# Altium footprint library Connectors.PcbLib: 135 footprints (part 8 of 9)
Each footprint in its own frame and in the unit in brackets; x right, y up, seen from the top. Pads: shape width x height; smd on the part's side, far side on the other; paste and mask are expansions set on the pad; w line width, h text height; cw(c..) or ccw(c..) is an arc to the next point about the centre after c.
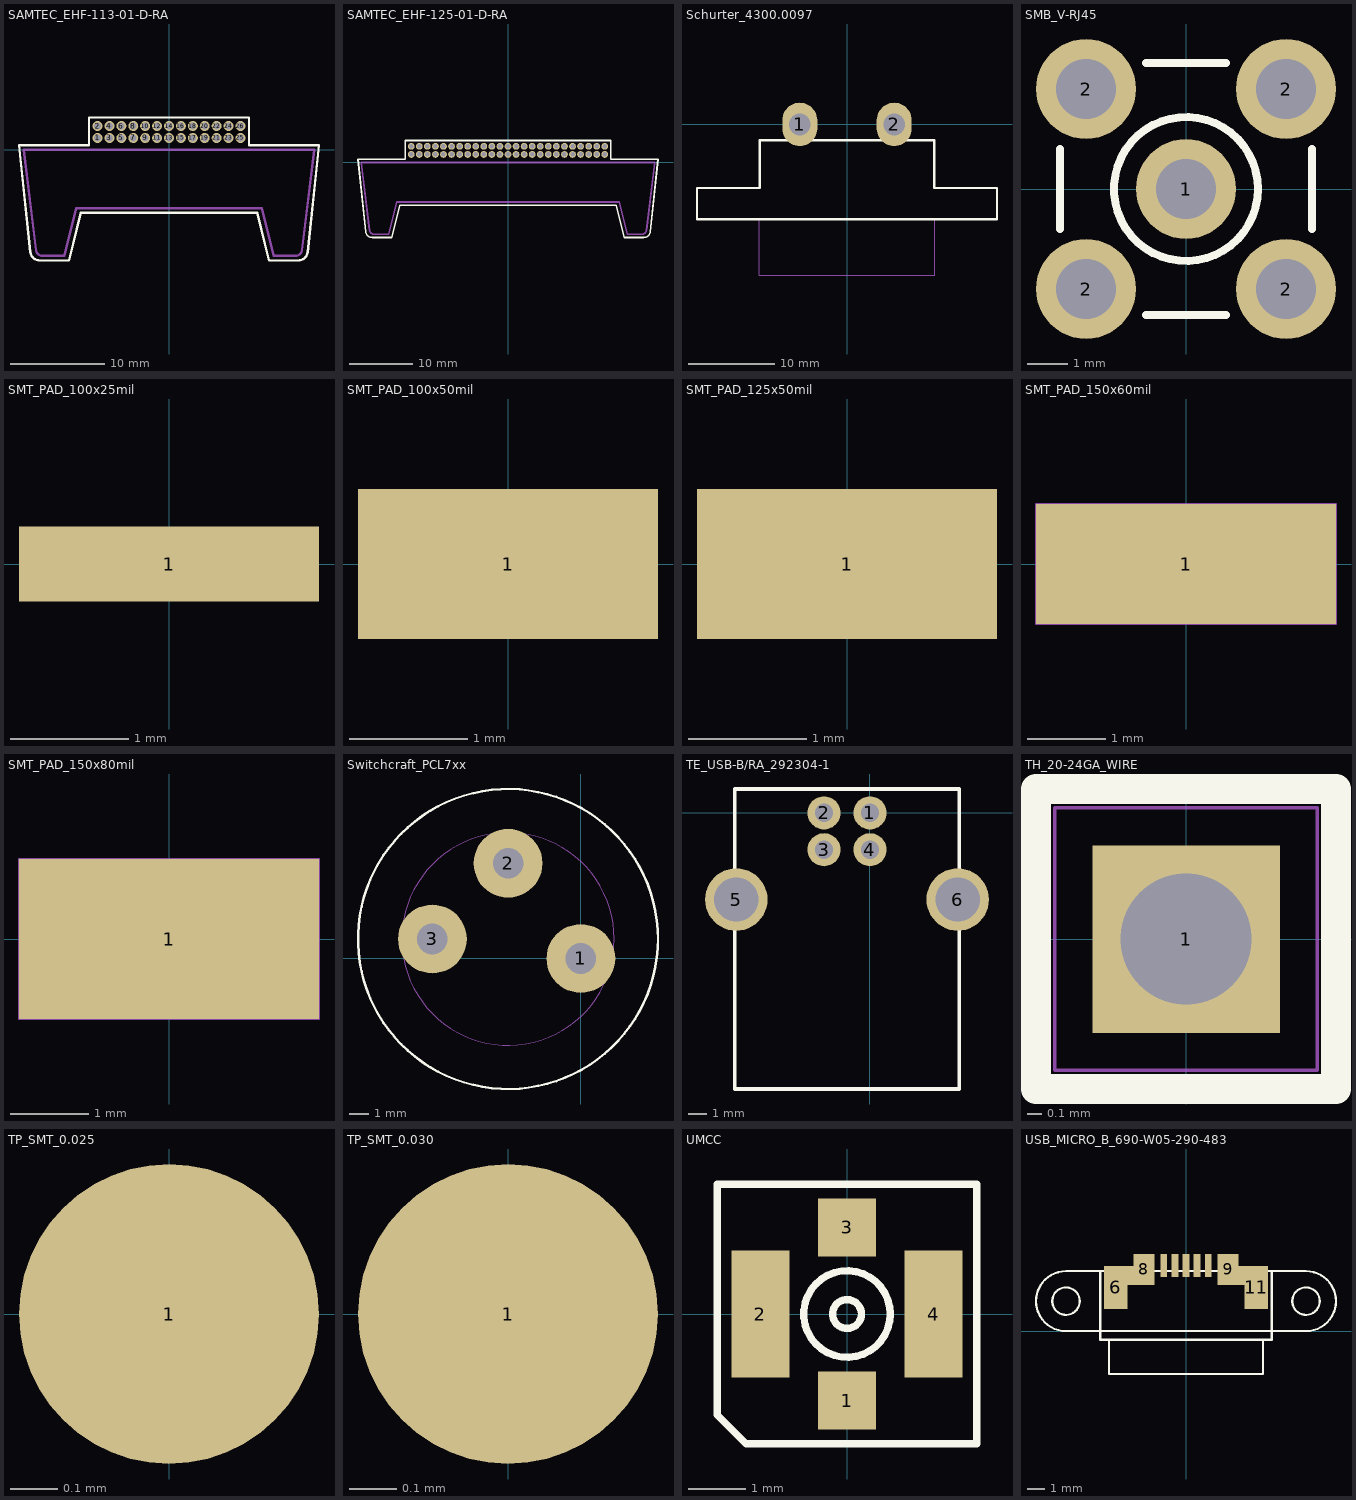
[diagram p7: the footprints below, top view; thin cyan lines are the x and y axes]

## SAMTEC_EHF-113-01-D-RA [mil]
pads (26):
  round 42 hole 28 mask+3: 1(-300,50) 2(-300,100) 3(-250,50) 4(-250,100) 5(-200,50) 6(-200,100) 7(-150,50) 8(-150,100) 9(-100,50) 10(-100,100) 11(-50,50) 12(-50,100) 13(0,50) 14(0,100) 15(50,50) 16(50,100) 17(100,50) 18(100,100) 19(150,50) 20(150,100) 21(200,50) 22(200,100) 23(250,50) 24(250,100) 25(300,50) 26(300,100)
Top Overlay:
  lines w10: -630,20 -336,20 -336,136 336,136 336,20 630,20 582.48,-429.21 cw(c542.7,-425) 542.7,-465 420,-465 370,-265 -370,-265 -420,-465 -542.7,-465 cw(c-542.7,-425) -582.48,-429.18 -630,20
Mechanical 1:
  lines w10: -610,0 -558.74,-420.82 ccw(c-531.45,-417.5) -531.45,-445 -440,-445 -390,-245 390,-245 440,-445 531.45,-445 ccw(c531.45,-417.5) 558.75,-420.8 610,0 -610,0
  text "J1" at -17.57,-108 h30

## SAMTEC_EHF-125-01-D-RA [mil]
pads (50):
  round 42 hole 28 mask+3: 1(-600,50) 2(-600,100) 3(-550,50) 4(-550,100) 5(-500,50) 6(-500,100) 7(-450,50) 8(-450,100) 9(-400,50) 10(-400,100) 11(-350,50) 12(-350,100) 13(-300,50) 14(-300,100) 15(-250,50) 16(-250,100) 17(-200,50) 18(-200,100) 19(-150,50) 20(-150,100) 21(-100,50) 22(-100,100) 23(-50,50) 24(-50,100) 25(0,50) 26(0,100) 27(50,50) 28(50,100) 29(100,50) 30(100,100) 31(150,50) 32(150,100) 33(200,50) 34(200,100) 35(250,50) 36(250,100) 37(300,50) 38(300,100) 39(350,50) 40(350,100) 41(400,50) 42(400,100) 43(450,50) 44(450,100) 45(500,50) 46(500,100) 47(550,50) 48(550,100) 49(600,50) 50(600,100)
Top Overlay:
  lines w10: -930,20 -636,20 -636,136 636,136 636,20 930,20 882.48,-429.21 cw(c842.7,-425) 842.7,-465 720,-465 670,-265 -670,-265 -720,-465 -842.7,-465 cw(c-842.7,-425) -882.48,-429.18 -930,20
Mechanical 1:
  lines w10: -910,0 -858.74,-420.82 ccw(c-831.45,-417.5) -831.45,-445 -740,-445 -690,-245 690,-245 740,-445 831.45,-445 ccw(c831.45,-417.5) 858.75,-420.8 910,0 -910,0
  text "J1" at -17.57,-108 h30

## Schurter_4300.0097 [mm] "IEC 320-C8 Power Entry Connector"
pads (2):
  oval 4.064x5.08 hole 2.54 paste-5.08: 1(-5.5,0) 2(5.5,0)
Top Overlay:
  lines w0.254: 17.491,-11 17.491,-11.048 ; 17.491,-11.048 17.491,-7.425 10.183,-7.425 10.183,-1.838 0,-1.838 -10.183,-1.838 -10.183,-7.425 -17.491,-7.425 -17.491,-11.048 17.491,-11.048
Mechanical 1:
  lines w0.127: -10.25,-11.025 -10.25,-17.6 10.25,-17.6 10.25,-11.025 ; 17.491,-11 17.491,-11.048 ; 17.491,-11.048 -17.491,-11.048 -17.491,-7.425 -10.183,-7.425 -10.183,-1.838 0,-1.838 10.183,-1.838 10.183,-7.425 17.491,-7.425 17.491,-11.048
3D body "4300-0097.stp": height 15, standoff -3.7, extent -17.5,-17.733 17.5,1.017

## SMB_V-RJ45 [mm] "Connector; SMB Straight"
pads (5):
  round 2.5 hole 1.5: 1(0,0) 2(-2.5,-2.5) 2(-2.5,2.5) 2(2.5,-2.5) 2(2.5,2.5)
Top Overlay:
  circle w0.2: c0,0 r1.8
  lines w0.2: -3.15,-1 -3.15,1 ; -1,-3.15 1,-3.15 ; -1,3.15 1,3.15 ; 3.15,-1 3.15,1
Mechanical 1:
  circle w0.025: c0,0 r1.8
  circle w0.025: c0,0 r1.05
  circle w0.025: c0,0 r0.2

## SMT_PAD_100x25mil [mm] "Surface Mount Pad For Wire"
height 0.025
pads (1):
  rect 2.54x0.635 smd paste+0 mask+0: 1(0,0)

## SMT_PAD_100x50mil [mm] "Surface Mount Pad For Wire"
height 0.025
pads (1):
  rect 2.54x1.27 smd paste+0 mask+0: 1(0,0)

## SMT_PAD_125x50mil [mm] "Surface Mount Pad For Wire"
height 0.025
pads (1):
  rect 2.54x1.27 smd paste+0 mask+0: 1(0,0)

## SMT_PAD_150x60mil [mil] "Surface Mount Pad For Wire"
height 1
pads (1):
  rect 150x60 smd paste+0 mask+0: 1(0,0)
Mechanical 1:
  lines w1: -75,-30 -75,30 75,30 75,-30 -75,-30
3D body: height 2, standoff 0, extent -75,-30 75,30

## SMT_PAD_150x80mil [mil] "Surface Mount Pad For Wire"
height 1
pads (1):
  rect 150x80 smd paste+0 mask+0: 1(0,0)
Mechanical 1:
  lines w1: -75,-40 -75,40 75,40 75,-40 -75,-40
3D body: height 2, standoff 0, extent -75,-40 75,40

## Switchcraft_PCL7xx [mm] "Barrel Jack, Sealed, Vertical TH"
height 12.9
pads (3):
  round 3.6 hole 1.6: 1(0,0) 2(-3.81,4.98) 3(-7.77,1.02)
Top Overlay:
  circle w0.127: c-3.813,1.02 r7.85
Mechanical 1:
  circle w0.025: c-3.813,1.02 r7.85
  circle w0.025: c0.017,-0.006 r0.486
  circle w0.025: c-3.785,4.99 r0.486
  circle w0.025: c-7.77,1.02 r0.486
  circle w0.025: c-3.813,1.02 r5.56
  text ".Designator" at -12.469,7.37 h1.52
3D body "PCL712AS.stp": height 3.59, standoff -22.71, extent -11.687,-6.854 4.061,8.894

## TE_USB-B/RA_292304-1 [mm] "Connector USB R/A Type B"
height 10.7
pads (6):
  round 1.8 hole 1: 1(0,0) 2(-2.5,0) 3(-2.5,-2) 4(0,-2)
  round 3.4 hole 2.4: 5(-7.27,-4.71) 6(4.77,-4.71)
Top Overlay:
  lines w0.2: -7.35,-15.01 -7.35,1.3 4.85,1.3 4.85,-15.01 -7.35,-15.01
3D body "292304-1-a-3d.stp": height 11.49, standoff -3.93, extent -8.445,-14.98 5.945,0.72

## TH_20-24GA_WIRE [mil] "Through hole for 20-24AWG Wire"
pads (1):
  rect 50x50 hole 35: 1(0,0)
Top Overlay:
  lines w7.87: -40,-40 40,-40 40,40 -40,40 -40,-40
Mechanical 1:
  circle w1: c0,0 r20
  lines w1: -35,-35 35,-35 35,35 -30,35 -35,35 -35,-35
  text ".Designator" at -25,45 h39.37

## TP_SMT_0.025 [mm] "Test Point, Surface Mount 25mil"
pads (1):
  round 0.635 smd paste-0.635: 1(0,0)

## TP_SMT_0.030 [mm] "Test Point, Surface Mount 30mil"
pads (1):
  round 0.635 smd paste-0.635: 1(0,0)

## UMCC [mm] "Ultra Minature Coaxial Connector"
height 0.025
pads (4):
  rect 1x1 smd: 1(0,-1.5) 3(0,1.5)
  rect 1x2.2 smd: 2(-1.5,0) 4(1.5,0)
Top Overlay:
  circle w0.127: c0,0 r0.75
  circle w0.127: c0,0 r0.25
  lines w0.127: -2.25,-1.75 -2.25,2.25 2.25,2.25 2.25,-2.25 -1.75,-2.25 -2.25,-1.75
Mechanical 1:
  text ".Designator" at -4.55,2.471 h1.02
3D body "734120110.stp": height 1.3, standoff 0, extent -1.5,-1.54 1.5,1.54

## USB_MICRO_B_690-W05-290-483 [mm] "EDAC 690-W05-290-483"
pads (11):
  rect 0.4x1.35 smd: 1(-1.3,3.825) 2(-0.65,3.825) 3(0,3.825) 4(0.65,3.825) 5(1.3,3.825)
  rect 1.39x2.5 smd: 6(-4.095,2.55) 11(4.095,2.55)
  rect 0.35x1.1 smd: 7(-3.225,3.25) 10(3.225,3.25)
  rect 1.2x1.8 smd: 8(-2.45,3.6) 9(2.45,3.6)
Top Overlay:
  circle w0.127: c7,1.75 r0.8
  circle w0.127: c-7,1.75 r0.8
  lines w0.127: -4.5,-0.5 -4.5,-2.5 4.5,-2.5 4.5,-0.5 ; -5,0 -5,3.5 ; -5,0 5,0 ; -5,0 -7,0 cw(c-7,1.75) -7,3.5 -5,3.5 ; -5,0 -5,-0.5 5,-0.5 5,0 ; -5,3.5 5,3.5 ; 5,0 5,3.5 ; 5,0 7,0 ccw(c7,1.75) 7,3.5 ; 5,3.5 7,3.5 ; 7,3.5 7,3.5
Mechanical 1:
  text ".Designator" at -2.05,0.221 h1.02
3D body "EDAC-690-W05-290-483.step": height 4.45, standoff -0.25, extent -8.5,-2.5 8.5,4.3